# Altium footprint library SWLIB(150721).PcbLib: 348 footprints (part 21 of 22)
Each footprint in its own frame and in the unit in brackets; x right, y up, seen from the top. Pads: shape width x height; smd on the part's side, far side on the other; paste and mask are expansions set on the pad; w line width, h text height; cw(c..) or ccw(c..) is an arc to the next point about the centre after c.
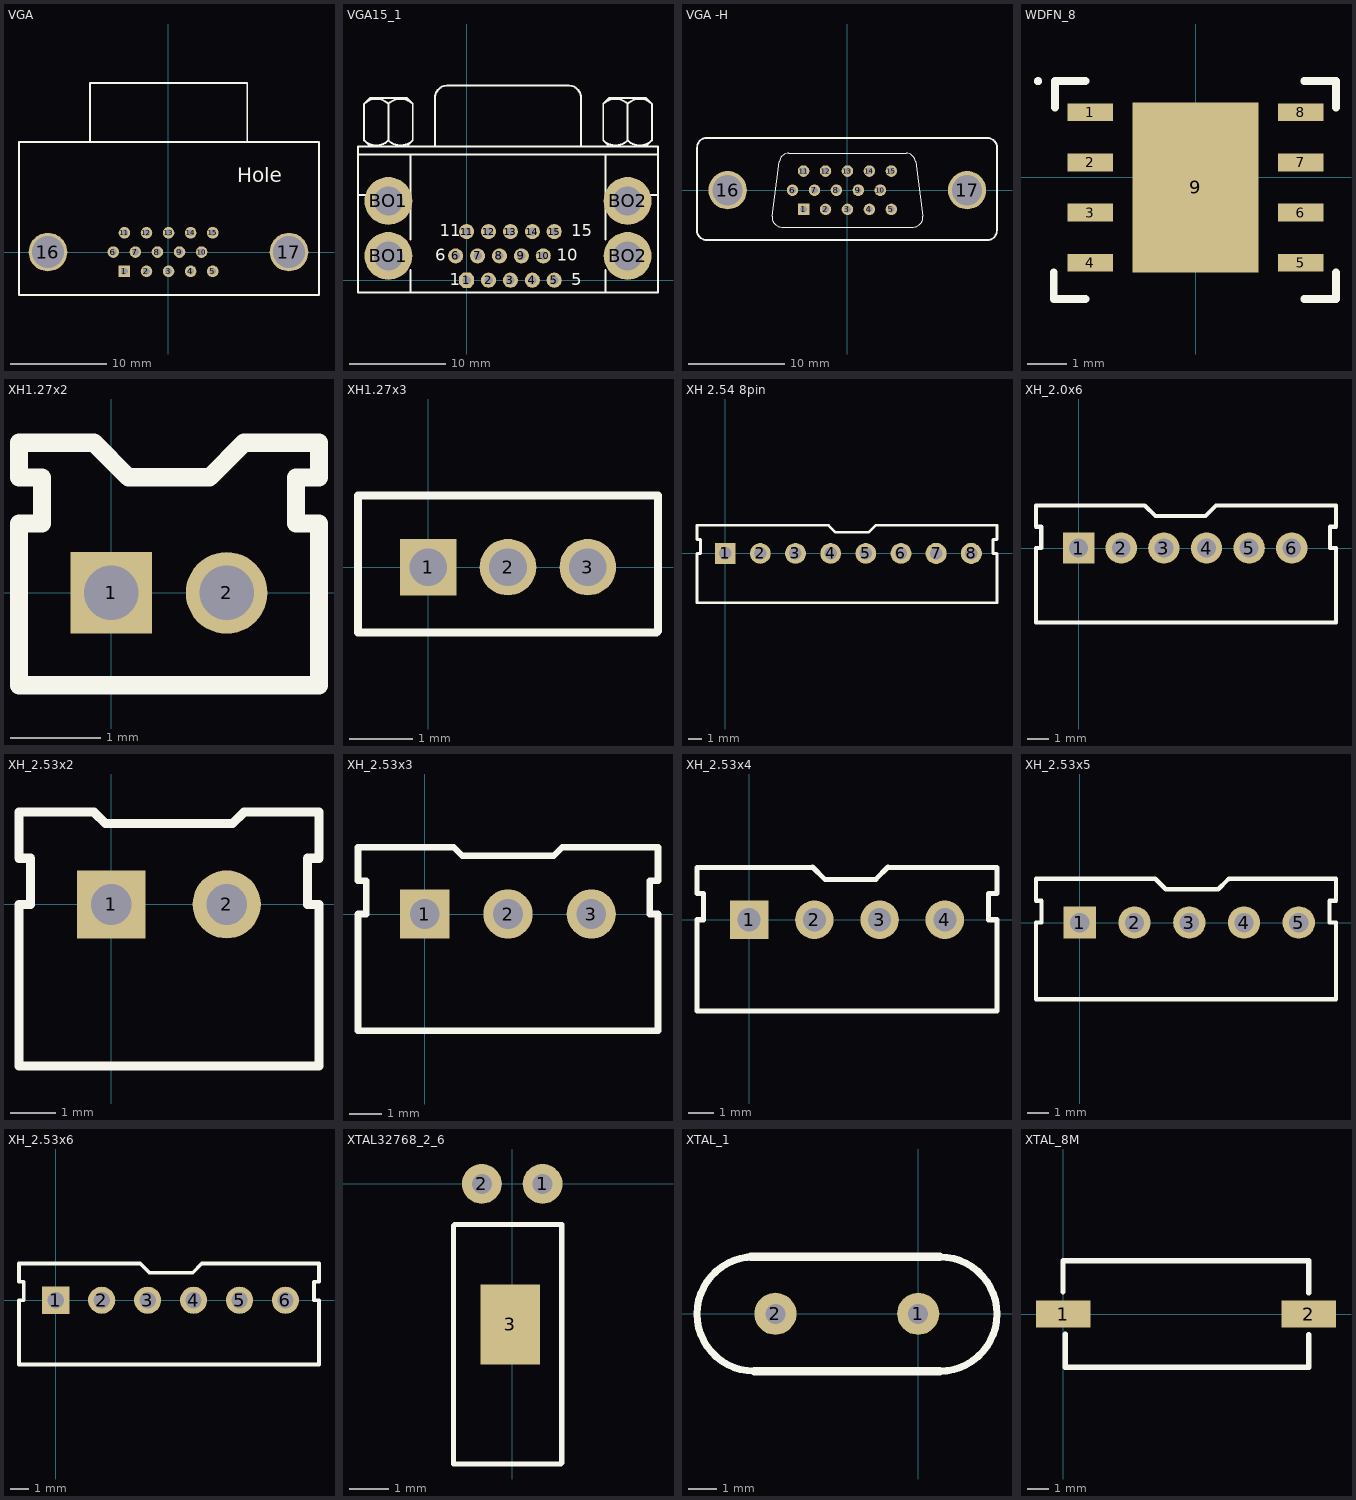
[diagram p20: the footprints below, top view; thin cyan lines are the x and y axes]

## VGA [mm]
pads (17):
  rect 1.2x1.2 hole 0.7: 1(-4.569,-2)
  round 1.2 hole 0.7: 2(-2.279,-2) 3(0.011,-2) 4(2.301,-2) 5(4.591,-2) 6(-5.722,0) 7(-3.432,0) 8(-1.141,0) 9(1.148,0) 10(3.438,0) 11(-4.569,2) 12(-2.279,2) 13(0.011,2) 14(2.301,2) 15(4.591,2)
  round 4 hole 3.3: 16(-12.497,0) 17(12.5,0)
Top Overlay:
  lines w0.203: -8.161,11.43 -8.161,17.526 8.171,17.526 8.171,11.43 ; -15.502,-4.445 15.613,-4.445 15.613,11.43 -15.502,11.43 -15.502,-4.445
  text "Hole" at 7.112,7.239 h1.52
Bottom Overlay:
  text "1" at -6.101,-2.921 h0.76
  text "10" at 4.567,-0.381 h0.76
  text "11" at -6.609,2.159 h0.76
  text "5" at 5.837,-2.921 h0.76
  text "15" at 5.71,2.159 h0.76
3D body: height 12.1, standoff 0, extent 4.195,-2.399 4.991,-1.601
3D body: height 12.1, standoff 0, extent 1.905,-2.399 2.701,-1.601
3D body: height 12.1, standoff 0, extent -0.385,-2.399 0.411,-1.601
3D body: height 12.1, standoff 0, extent -2.675,-2.399 -1.878,-1.601
3D body: height 12.1, standoff 0, extent 3.042,-0.399 3.839,0.399
3D body: height 12.1, standoff 0, extent 0.752,-0.399 1.548,0.399
3D body: height 12.1, standoff 0, extent -1.538,-0.399 -0.741,0.399
3D body: height 12.1, standoff 0, extent -3.828,-0.399 -3.031,0.399
3D body: height 12.1, standoff 0, extent 4.195,1.601 4.991,2.399
3D body: height 12.1, standoff 0, extent 1.905,1.601 2.701,2.399
3D body: height 12.1, standoff 0, extent -0.385,1.601 0.411,2.399
3D body: height 12.1, standoff 0, extent -2.675,1.601 -1.878,2.399
3D body: height 12.1, standoff 0, extent -3.828,-0.399 -3.031,0.399
3D body: height 12.1, standoff 0, extent -4.965,-2.399 -4.169,-1.601
3D body: height 12.1, standoff 0, extent -6.118,-0.399 -5.321,0.399
3D body: height 12.1, standoff 0, extent -4.965,1.601 -4.169,2.399

## VGA15_1 [mil]
pads (19):
  oct 62x62 hole 35: 1(0,0)
  round 62 hole 35: 2(90,0) 3(180,0) 4(270,0) 5(360,0) 6(-45,100) 7(45,100) 8(135,100) 9(225,100) 10(315,100) 11(0,200) 12(90,200) 13(180,200) 14(270,200) 15(360,200)
  round 196.67 hole 118.33: BO1(-321.67,100) BO1(-321.67,325.83) BO2(661.67,100) BO2(661.67,325.83)
Top Overlay:
  lines w8: -446.67,350 -230,350 ; -446.67,516.67 786.67,516.67 ; -421.75,574.91 ccw(c-371.67,625) -321.58,574.91 ; -421.75,725.09 cw(c-371.67,675) -321.58,725.09 ; -396.67,550 -421.67,575 -421.67,725 -396.67,750 -246.67,750 -221.67,725 -221.67,575 -246.67,550 ; -321.75,574.91 ccw(c-271.67,625) -221.58,574.91 ; -321.75,725.09 cw(c-271.67,675) -221.58,725.09 ; -321.67,575 -321.67,725 ; -230,-50 -230,41.67 ; -230,166.67 -230,350 ; -230,516.67 -230,350 ; -130,550 -130,750 cw(c-80,750) -80,800 420,800 cw(c420,750) 470,750 470,550 ; 561.58,574.91 ccw(c611.67,625) 661.75,574.91 ; 561.58,725.09 cw(c611.67,675) 661.75,725.09 ; 570,-50 570,41.67 ; 570,166.67 570,350 ; 570,516.67 570,350 ; 586.67,550 561.67,575 561.67,725 586.67,750 736.67,750 761.67,725 761.67,575 736.67,550 ; 661.58,574.91 ccw(c711.67,625) 761.75,574.91 ; 661.58,725.09 cw(c711.67,675) 761.75,725.09 ; 661.67,575 661.67,725 ; 786.67,350 570,350 ; -446.67,-50 786.67,-50 786.67,550 -446.67,550 -446.67,-50
  text "1" at -70,-20 h50
  text "6" at -130,80 h50
  text "11" at -110,180 h50
  text "15" at 430,180 h50
  text "10" at 370,80 h50
  text "5" at 430,-20 h50

## VGA -H [mm]
pads (17):
  rect 1.2x1.2 hole 0.7: 1(-4.572,-2)
  round 1.2 hole 0.7: 2(-2.282,-2) 3(0.008,-2) 4(2.298,-2) 5(4.588,-2) 6(-5.725,0) 7(-3.435,0) 8(-1.145,0) 9(1.145,0) 10(3.435,0) 11(-4.572,2) 12(-2.282,2) 13(0.008,2) 14(2.298,2) 15(4.588,2)
  round 4 hole 3.15: 16(-12.5,0) 17(12.497,0)
Top Overlay:
  lines w0.127: -7.845,-2.72 ccw(c-6.853,-2.849) -6.853,-3.849 6.871,-3.849 ccw(c6.871,-2.849) 7.862,-2.72 7.122,2.98 ccw(c6.13,2.851) 6.13,3.851 -6.113,3.851 ccw(c-6.113,2.851) -7.104,2.98 -7.845,-2.72
  lines w0.203: -15.697,-4.216 ccw(c-14.697,-4.195) -14.685,-5.195 ; -15.697,-4.183 -15.697,4.47 ; -15.685,4.449 cw(c-14.685,4.461) -14.707,5.461 14.63,5.461 ; -14.673,-5.207 14.63,-5.207 ccw(c14.609,-4.207) 15.609,-4.195 ; 14.609,5.449 cw(c14.621,4.449) 15.621,4.47 ; 15.613,-4.224 15.613,4.478
Bottom Overlay:
  text "1" at -6.104,-2.921 h0.76
  text "5" at 5.834,-2.921 h0.76
  text "6" at -7.501,-0.381 h0.76
  text "10" at 4.564,-0.381 h0.76
  text "11" at -6.612,2.159 h0.76
  text "15" at 5.707,2.159 h0.76
3D body: height 12.1, standoff 0, extent 4.191,-2.399 4.988,-1.601
3D body: height 12.1, standoff 0, extent 1.901,-2.399 2.698,-1.601
3D body: height 12.1, standoff 0, extent -0.389,-2.399 0.408,-1.601
3D body: height 12.1, standoff 0, extent -2.679,-2.399 -1.882,-1.601
3D body: height 12.1, standoff 0, extent 3.038,-0.399 3.835,0.399
3D body: height 12.1, standoff 0, extent 0.748,-0.399 1.545,0.399
3D body: height 12.1, standoff 0, extent -1.541,-0.399 -0.745,0.399
3D body: height 12.1, standoff 0, extent -3.831,-0.399 -3.035,0.399
3D body: height 12.1, standoff 0, extent 4.191,1.601 4.988,2.399
3D body: height 12.1, standoff 0, extent 1.901,1.601 2.698,2.399
3D body: height 12.1, standoff 0, extent -0.389,1.601 0.408,2.399
3D body: height 12.1, standoff 0, extent -2.679,1.601 -1.882,2.399
3D body: height 12.1, standoff 0, extent -3.831,-0.399 -3.035,0.399
3D body: height 12.1, standoff 0, extent -4.969,-2.399 -4.172,-1.601
3D body: height 12.1, standoff 0, extent -6.122,-0.399 -5.325,0.399
3D body: height 11, standoff 0, extent 10.691,-2.097 14.675,1.895
3D body: height 11, standoff 0, extent -14.484,-1.996 -10.5,1.996
3D body: height 2, standoff 0, extent -15.748,-5.309 15.57,5.486
3D body: height 12, standoff 0, extent -7.925,-3.912 7.874,3.886
3D body: height 12.1, standoff 0, extent -4.969,1.601 -4.172,2.399

## WDFN_8 [mm]
height 5.7
pads (9):
  rect 1.15x0.45 smd: 1(-2.667,1.651) 2(-2.667,0.381) 3(-2.667,-0.889) 4(-2.667,-2.159) 5(2.667,-2.159) 6(2.667,-0.889) 7(2.667,0.381) 8(2.667,1.651)
  rect 3.19x4.3 smd paste-1.595 mask+0: 9(0,-0.254)
Top Overlay:
  circle w0.1: c-3.989,2.438 r0.05
  lines w0.2: -3.589,-2.403 -3.589,-3.073 -2.784,-3.073 ; -3.556,1.768 -3.556,2.438 -2.784,2.438 ; 2.751,-3.073 3.556,-3.073 3.556,-2.403 ; 2.751,2.438 3.556,2.438 3.556,1.768
Top Paste:
  rectangle: 0.1,-2.299 1.5,-1.069
  rectangle: 0.1,-0.869 1.5,0.361
  rectangle: 0.1,0.561 1.5,1.791
  rectangle: -1.5,-2.299 -0.1,-1.069
  rectangle: -1.5,-0.869 -0.1,0.361
  rectangle: -1.5,0.561 -0.1,1.791
3D body "User Library-WSON-8.STEP": height 0.81, standoff 0.01, extent -2.921,-2.754 3.079,2.246

## XH1.27x2 [mm]
pads (2):
  rect 0.9x0.9 hole 0.6: 1(0,0)
  round 0.9 hole 0.6: 2(1.27,0)
Top Overlay:
  lines w0.2: -1.016,-1.016 -1.016,0.762 -0.762,0.762 -0.762,1.016 -0.762,1.27 -1.016,1.27 -1.016,1.651 ; 2.286,-1.016 2.286,0.762 2.032,0.762 2.032,1.016 2.032,1.27 2.286,1.27 2.286,1.651
  lines w0.203: -1.016,-1.016 2.286,-1.016 ; -1.016,1.651 -0.191,1.651 0.191,1.27 1.079,1.27 1.46,1.651 2.286,1.651

## XH1.27x3 [mm]
pads (3):
  rect 0.9x0.9 hole 0.6: 1(0,0)
  round 0.9 hole 0.6: 2(1.27,0) 3(2.54,0)
Top Overlay:
  lines w0.127: -1.118,-1.041 -1.118,1.143 -0.508,1.143 3.658,1.143 3.658,-1.016 3.632,-1.041 -1.118,-1.041

## XH 2.54 8pin [mm]
pads (8):
  rect 1.5x1.5 hole 0.9: 1(0,0)
  round 1.5 hole 0.9: 2(2.54,0) 3(5.08,0) 4(7.62,0) 5(10.16,0) 6(12.7,0)
  round 1.524 hole 0.889: 7(15.24,0) 8(17.78,0)
Top Overlay:
  lines w0.2: -2.032,-3.556 -2.032,-2.54 -2.032,0 -1.778,0 -1.778,1.016 -2.032,1.016 -2.032,2.032 4.674,2.032 7.468,2.032 7.976,1.524 10.363,1.524 10.871,2.032 14.554,2.032 19.634,2.032 19.634,1.016 19.355,1.016 19.355,0 19.634,0 19.634,-3.556 14.554,-3.556 -2.032,-3.556

## XH_2.0x6 [mm]
pads (6):
  rect 1.5x1.5 hole 0.9: 1(0,0)
  round 1.5 hole 0.9: 2(2.032,0) 3(4.064,0) 4(6.096,0) 5(8.128,0) 6(10.16,0)
Top Overlay:
  lines w0.2: -2.032,-3.556 -2.032,-2.54 -2.032,0 -1.778,0 -1.778,1.016 -2.032,1.016 -2.032,2.032 3.15,2.032 3.658,1.524 6.045,1.524 6.553,2.032 12.268,2.032 12.268,1.016 11.989,1.016 11.989,0 12.268,0 12.268,-3.556 -2.032,-3.556

## XH_2.53x2 [mm]
pads (2):
  rect 1.5x1.5 hole 0.9: 1(0,0)
  round 1.5 hole 0.9: 2(2.54,0)
Top Overlay:
  lines w0.2: -2.032,-3.556 4.572,-3.556 4.572,0 4.318,0 4.318,1.016 4.572,1.016 4.572,2.032 2.921,2.032 2.667,1.778 -0.127,1.778 -0.381,2.032 -2.032,2.032 -2.032,1.016 -1.778,1.016 -1.778,0 -2.032,0 -2.032,-2.54 -2.032,-3.556
3D body "JS-1132-2.STEP": height 6, standoff -2.5, extent -1.631,-1.666 4.069,2.134

## XH_2.53x3 [mm]
pads (3):
  rect 1.5x1.5 hole 0.9: 1(0,0)
  round 1.5 hole 0.9: 2(2.54,0) 3(5.08,0)
Top Overlay:
  lines w0.2: -2.032,-3.556 7.112,-3.556 7.112,0 6.858,0 6.858,1.016 7.112,1.016 7.112,2.032 4.191,2.032 3.937,1.778 1.143,1.778 0.889,2.032 -2.032,2.032 -2.032,1.016 -1.778,1.016 -1.778,0 -2.032,0 -2.032,-2.54 -2.032,-3.556
3D body "JS-1132-3.STEP": height 6, standoff -2.5, extent -2.536,-1.651 7.464,2.149

## XH_2.53x4 [mm]
pads (4):
  rect 1.5x1.5 hole 0.9: 1(0,0)
  round 1.5 hole 0.9: 2(2.54,0) 3(5.08,0) 4(7.62,0)
Top Overlay:
  lines w0.127: 2.438,2.032 2.464,2.057
  lines w0.2: 2.438,2.032 -2.032,2.032 -2.032,1.016 -1.778,1.016 -1.778,0 -2.032,0 -2.032,-2.54 -2.032,-3.556 9.652,-3.556 9.652,0 9.322,0 9.322,1.016 9.652,1.016 9.652,2.032 5.41,2.032 ; 2.464,2.057 2.946,1.575 4.928,1.575 5.41,2.057
3D body "JS-1132-4.STEP": height 6, standoff -2.5, extent -2.238,-1.651 10.262,2.149

## XH_2.53x5 [mm]
pads (5):
  rect 1.5x1.5 hole 0.9: 1(0,0)
  round 1.5 hole 0.9: 2(2.54,0) 3(5.08,0) 4(7.62,0) 5(10.16,0)
Top Overlay:
  lines w0.2: 6.858,1.981 6.426,1.549 3.988,1.549 3.505,2.032 -2.032,2.032 -2.032,1.016 -1.778,1.016 -1.778,0 -2.032,0 -2.032,-2.54 -2.032,-3.556 11.887,-3.556 11.887,0 11.582,0 11.582,1.016 11.887,1.016 11.887,2.032 6.909,2.032
3D body "JS-1132-5.STEP": height 6, standoff -2.5, extent -2.249,-1.626 12.751,2.174

## XH_2.53x6 [mm]
pads (6):
  rect 1.5x1.5 hole 0.9: 1(0,0)
  round 1.5 hole 0.9: 2(2.54,0) 3(5.08,0) 4(7.62,0) 5(10.16,0) 6(12.7,0)
Top Overlay:
  lines w0.2: -2.032,-3.556 -2.032,-2.54 -2.032,0 -1.778,0 -1.778,1.016 -2.032,1.016 -2.032,2.032 4.674,2.032 5.182,1.524 7.569,1.524 8.077,2.032 14.554,2.032 14.554,1.016 14.275,1.016 14.275,0 14.554,0 14.554,-3.556 -2.032,-3.556
3D body "JS-1132-6.STEP": height 6, standoff -2.5, extent -2.362,-1.626 15.138,2.174

## XTAL32768_2_6 [mm]
pads (3):
  round 1 hole 0.5: 1(0.762,0) 2(-0.762,0)
  rect 1.5x2 smd: 3(-0.051,-3.531)
Top Overlay:
  lines w0.127: -1.473,-1.041 -1.473,-7.036 1.219,-7.036 1.245,-7.01 1.245,-1.016 -1.448,-1.016

## XTAL_1 [mm]
pads (2):
  round 1.5 hole 0.711: 1(0,0) 2(-5.08,0)
Top Overlay:
  lines w0.254: -5.835,-2.039 cw(c-5.835,-0.007) -5.835,2.025 ; 0.769,-2.043 ccw(c0.769,-0.011) 0.769,2.021
  lines w0.305: -5.962,2.025 0.769,2.025 ; -5.835,-2.039 0.769,-2.039

## XTAL_8M [mm]
pads (2):
  rect 2.54x1.27 smd: 1(0,0) 2(11.5,0)
Top Overlay:
  lines w0.254: -0.007,1.031 -0.007,2.5 2.345,2.5 9.15,2.5 11.503,2.5 11.503,0.991 ; 0.095,-0.951 0.095,-2.5 2.35,-2.5 9.15,-2.5 11.503,-2.5 11.503,-0.98
3D body: height 4, standoff 0.2, extent 0.737,-2.083 10.719,1.6